# Altium footprint library STAXB_MODULE.PcbLib: 1 footprints
Each footprint in its own frame and in the unit in brackets; x right, y up, seen from the top. Pads: shape width x height; smd on the part's side, far side on the other; paste and mask are expansions set on the pad; w line width, h text height; cw(c..) or ccw(c..) is an arc to the next point about the centre after c.
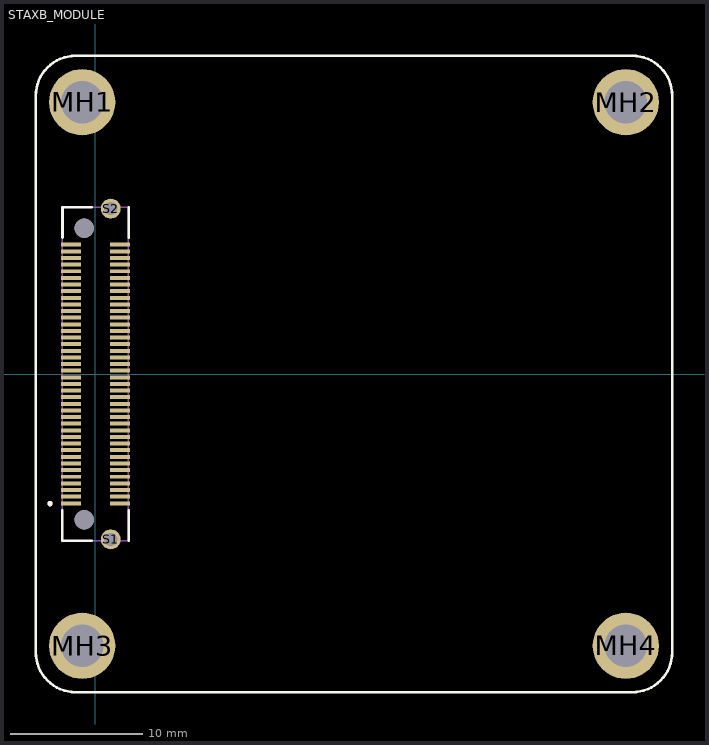
[diagram p0: the footprint, top view; thin cyan lines are the x and y axes]

## STAXB_MODULE [mm]
pads (88):
  rect 1.5x0.3 smd mask+0.05: 1(-1.85,-9.75) 2(1.85,-9.75) 3(-1.85,-9.25) 4(1.85,-9.25) 5(-1.85,-8.75) 6(1.85,-8.75) 7(-1.85,-8.25) 8(1.85,-8.25) 9(-1.85,-7.75) 10(1.85,-7.75) 11(-1.85,-7.25) 12(1.85,-7.25) 13(-1.85,-6.75) 14(1.85,-6.75) 15(-1.85,-6.25) 16(1.85,-6.25) 17(-1.85,-5.75) 18(1.85,-5.75) 19(-1.85,-5.25) 20(1.85,-5.25) 21(-1.85,-4.75) 22(1.85,-4.75) 23(-1.85,-4.25) 24(1.85,-4.25) 25(-1.85,-3.75) 26(1.85,-3.75) 27(-1.85,-3.25) 28(1.85,-3.25) 29(-1.85,-2.75) 30(1.85,-2.75) 31(-1.85,-2.25) 32(1.85,-2.25) 33(-1.85,-1.75) 34(1.85,-1.75) 35(-1.85,-1.25) 36(1.85,-1.25) 37(-1.85,-0.75) 38(1.85,-0.75) 39(-1.85,-0.25) 40(1.85,-0.25) 41(-1.85,0.25) 42(1.85,0.25) 43(-1.85,0.75) 44(1.85,0.75) 45(-1.85,1.25) 46(1.85,1.25) 47(-1.85,1.75) 48(1.85,1.75) 49(-1.85,2.25) 50(1.85,2.25) 51(-1.85,2.75) 52(1.85,2.75) 53(-1.85,3.25) 54(1.85,3.25) 55(-1.85,3.75) 56(1.85,3.75) 57(-1.85,4.25) 58(1.85,4.25) 59(-1.85,4.75) 60(1.85,4.75) 61(-1.85,5.25) 62(1.85,5.25) 63(-1.85,5.75) 64(1.85,5.75) 65(-1.85,6.25) 66(1.85,6.25) 67(-1.85,6.75) 68(1.85,6.75) 69(-1.85,7.25) 70(1.85,7.25) 71(-1.85,7.75) 72(1.85,7.75) 73(-1.85,8.25) 74(1.85,8.25) 75(-1.85,8.75) 76(1.85,8.75) 77(-1.85,9.25) 78(1.85,9.25) 79(-1.85,9.75) 80(1.85,9.75)
  round 5 hole 3.2: MH1(-1,20.5) MH2(40,20.5) MH3(-1,-20.5) MH4(40,-20.5)
  round 1.5 hole 1: S1(1.15,-12.475) S2(1.15,12.475)
  round 1.45 hole 1.45 unplated: ""(-0.85,-11) ""(-0.85,11)
Top Overlay:
  circle w0.2: c-3.429,-9.779 r0.1
  lines w0.2: -2.51,-12.575 -2.51,-10.3 ; -2.49,-12.575 -0.3,-12.575 ; -2.49,10.3 -2.49,12.575 -0.3,12.575 ; 2.51,-12.575 2.51,-10.3 ; 2.51,10.3 2.51,12.575 ; -4.5,-21 ccw(c-1.5,-21) -1.5,-24 40.5,-24 ccw(c40.5,-21) 43.5,-21 43.5,21 ccw(c40.5,21) 40.5,24 -1.5,24 ccw(c-1.5,21) -4.5,21 -4.5,-21
Top Paste:
  circle w1: c1.15,-12.475 r0.5
  circle w1: c1.15,12.475 r0.5
Top Assembly:
  circle w0.2: c-3.429,-9.779 r0.1
  lines w0.1: -2.49,-12.575 2.49,-12.575 2.49,12.575 -2.49,12.575 -2.49,-12.575
3D body "StaxB.step": height 9.81, standoff 1.54, extent -4.596,-24.043 43.404,23.957
3D body "LSHM-140-03.0-L-DV-A-S-K-TR.SLDPRT": height 4.6, standoff -1.5, extent -2.49,-12.901 2.54,12.901